# Altium footprint library Supernova Connectors.PcbLib: 303 footprints (part 10 of 19)
Each footprint in its own frame and in the unit in brackets; x right, y up, seen from the top. Pads: shape width x height; smd on the part's side, far side on the other; paste and mask are expansions set on the pad; w line width, h text height; cw(c..) or ccw(c..) is an arc to the next point about the centre after c.
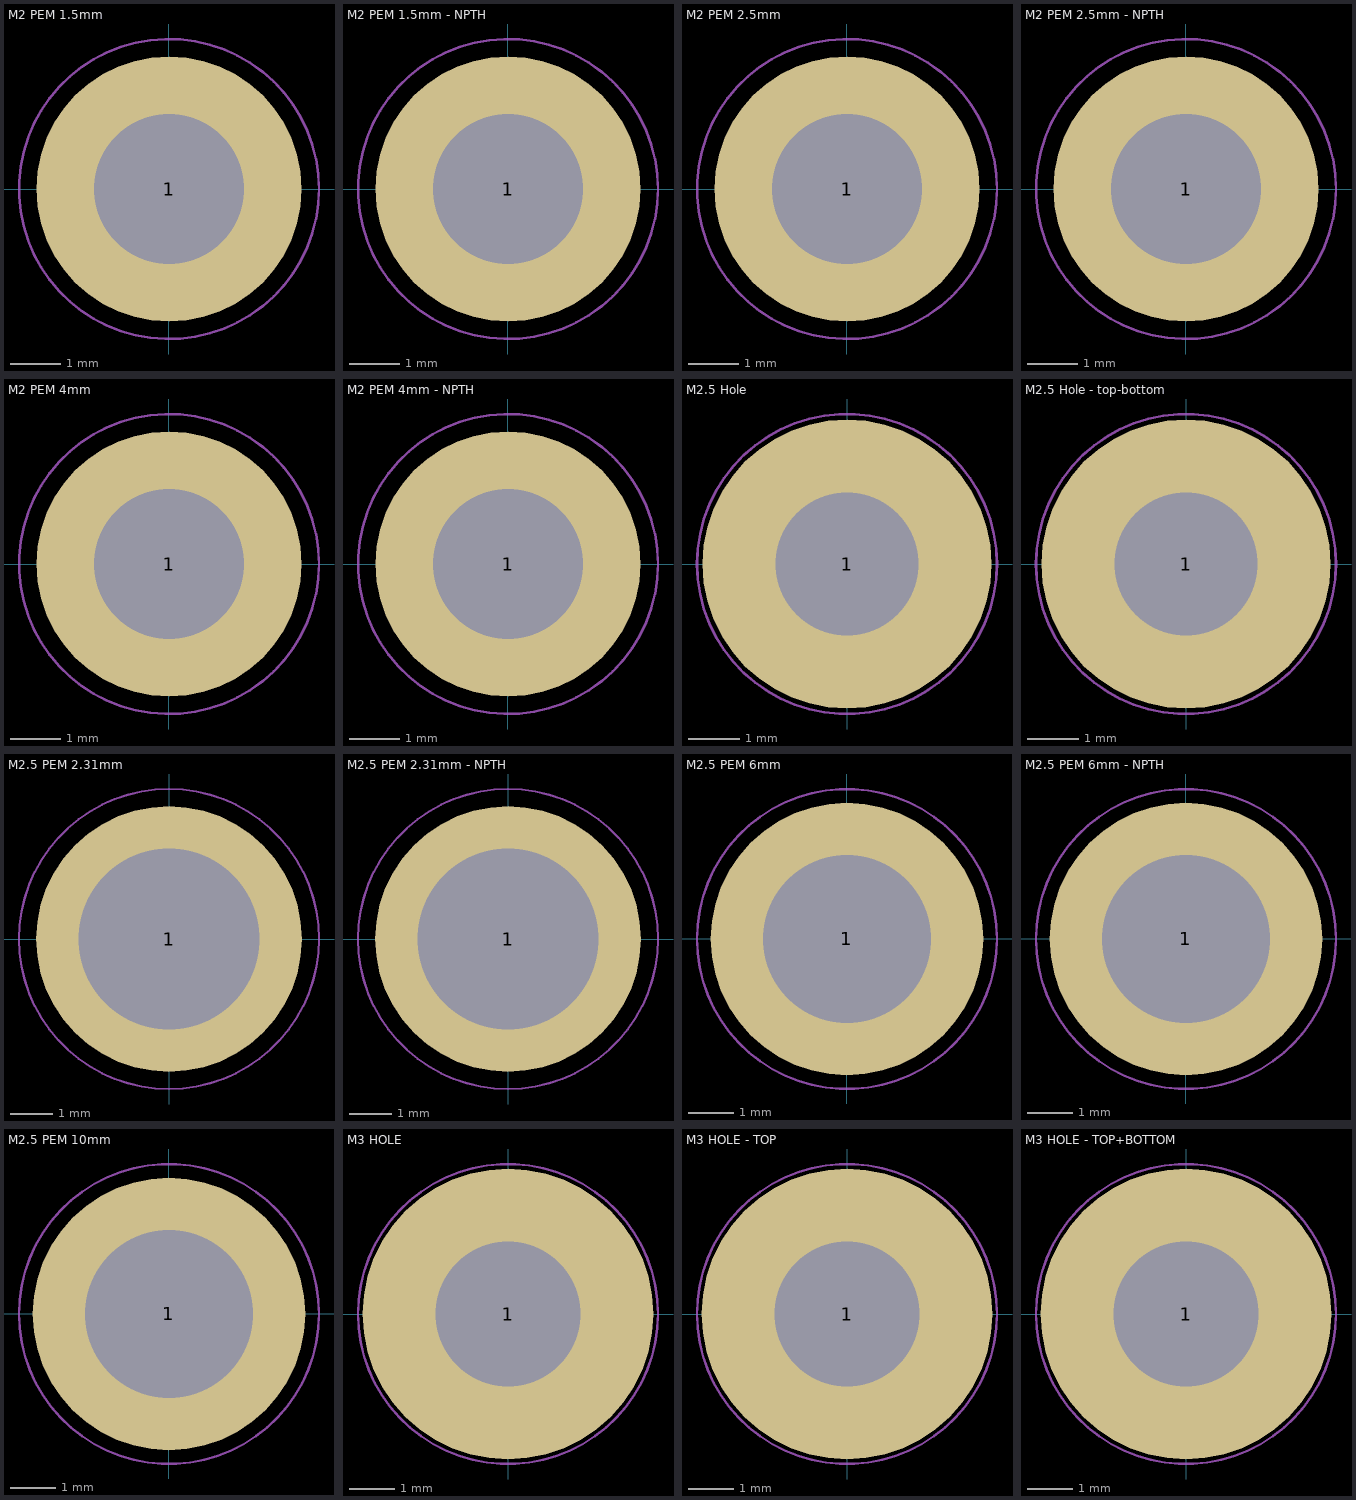
[diagram p9: the footprints below, top view; thin cyan lines are the x and y axes]

## M2 PEM 1.5mm [mm] "2.5mm M2 PEM"
height 2.5
pads (1):
  round 5.3 / inner round 0 / far side round 3.5 hole 3: 1(0,0)
Top Paste:
  region: 0.3,-2.542 0.3,-1.521 0.411,-1.494 0.627,-1.418 0.829,-1.31 1.012,-1.174 1.174,-1.012 1.31,-0.828 1.418,-0.627 1.495,-0.411 1.521,-0.3 2.543,-0.3 2.543,-0.298 2.518,-0.511 2.398,-0.922 2.211,-1.308 1.963,-1.658 1.659,-1.961 1.31,-2.21 0.924,-2.397 0.513,-2.517
  region: 2.542,0.3 1.521,0.3 1.495,0.411 1.418,0.627 1.31,0.829 1.174,1.012 1.012,1.174 0.829,1.31 0.627,1.418 0.411,1.495 0.3,1.521 0.3,2.543 0.298,2.543 0.511,2.518 0.923,2.398 1.308,2.211 1.658,1.963 1.961,1.659 2.21,1.31 2.397,0.924 2.517,0.513
  region: -0.3,2.542 -0.3,1.521 -0.411,1.495 -0.627,1.418 -0.828,1.31 -1.012,1.174 -1.174,1.012 -1.31,0.829 -1.418,0.627 -1.494,0.411 -1.521,0.3 -2.543,0.3 -2.543,0.298 -2.518,0.511 -2.398,0.923 -2.211,1.308 -1.962,1.658 -1.659,1.961 -1.31,2.21 -0.924,2.397 -0.513,2.517
  region: -2.542,-0.3 -1.521,-0.3 -1.494,-0.411 -1.418,-0.627 -1.31,-0.828 -1.174,-1.012 -1.012,-1.174 -0.828,-1.31 -0.627,-1.418 -0.411,-1.494 -0.3,-1.521 -0.3,-2.543 -0.298,-2.543 -0.511,-2.518 -0.922,-2.398 -1.308,-2.211 -1.658,-1.962 -1.961,-1.659 -2.21,-1.31 -2.397,-0.924 -2.517,-0.513
Top Courtyard:
  circle w0.05: c0,0 r3
  lines w0.1: -0.5,0 0.5,0 ; 0,-0.5 0,0.5
3D body "9774015243R (rev1).stp": height 1.5, standoff -1.4, extent -2.175,-2.172 2.175,2.172

## M2 PEM 1.5mm - NPTH [mm] "2.5mm M2 PEM"
height 2.5
pads (1):
  round 5.3 / inner round 0 / far side round 0 hole 3 unplated: 1(0,0)
Top Paste:
  region: -2.542,-0.3 -1.521,-0.3 -1.494,-0.411 -1.418,-0.627 -1.31,-0.828 -1.174,-1.012 -1.012,-1.174 -0.828,-1.31 -0.627,-1.418 -0.411,-1.494 -0.3,-1.521 -0.3,-2.543 -0.298,-2.543 -0.511,-2.518 -0.922,-2.398 -1.308,-2.211 -1.658,-1.962 -1.961,-1.659 -2.21,-1.31 -2.397,-0.924 -2.517,-0.513
  region: -0.3,2.542 -0.3,1.521 -0.411,1.495 -0.627,1.418 -0.828,1.31 -1.012,1.174 -1.174,1.012 -1.31,0.829 -1.418,0.627 -1.494,0.411 -1.521,0.3 -2.543,0.3 -2.543,0.298 -2.518,0.511 -2.398,0.923 -2.211,1.308 -1.962,1.658 -1.659,1.961 -1.31,2.21 -0.924,2.397 -0.513,2.517
  region: 2.542,0.3 1.521,0.3 1.495,0.411 1.418,0.627 1.31,0.829 1.174,1.012 1.012,1.174 0.829,1.31 0.627,1.418 0.411,1.495 0.3,1.521 0.3,2.543 0.298,2.543 0.511,2.518 0.923,2.398 1.308,2.211 1.658,1.963 1.961,1.659 2.21,1.31 2.397,0.924 2.517,0.513
  region: 0.3,-2.542 0.3,-1.521 0.411,-1.494 0.627,-1.418 0.829,-1.31 1.012,-1.174 1.174,-1.012 1.31,-0.828 1.418,-0.627 1.495,-0.411 1.521,-0.3 2.543,-0.3 2.543,-0.298 2.518,-0.511 2.398,-0.922 2.211,-1.308 1.963,-1.658 1.659,-1.961 1.31,-2.21 0.924,-2.397 0.513,-2.517
Top Courtyard:
  circle w0.05: c0,0 r3
  lines w0.1: -0.5,0 0.5,0 ; 0,-0.5 0,0.5
3D body "9774015243R (rev1).stp": height 1.5, standoff -1.4, extent -2.175,-2.172 2.175,2.172

## M2 PEM 2.5mm [mm] "2.5mm M2 PEM"
height 2.5
pads (1):
  round 5.3 / inner round 0 / far side round 3.5 hole 3: 1(0,0)
Top Paste:
  region: -2.542,-0.3 -1.521,-0.3 -1.494,-0.411 -1.418,-0.627 -1.31,-0.828 -1.174,-1.012 -1.012,-1.174 -0.828,-1.31 -0.627,-1.418 -0.411,-1.494 -0.3,-1.521 -0.3,-2.543 -0.298,-2.543 -0.511,-2.518 -0.922,-2.398 -1.308,-2.211 -1.658,-1.962 -1.961,-1.659 -2.21,-1.31 -2.397,-0.924 -2.517,-0.513
  region: -0.3,2.542 -0.3,1.521 -0.411,1.495 -0.627,1.418 -0.828,1.31 -1.012,1.174 -1.174,1.012 -1.31,0.829 -1.418,0.627 -1.494,0.411 -1.521,0.3 -2.543,0.3 -2.543,0.298 -2.518,0.511 -2.398,0.923 -2.211,1.308 -1.962,1.658 -1.659,1.961 -1.31,2.21 -0.924,2.397 -0.513,2.517
  region: 2.542,0.3 1.521,0.3 1.495,0.411 1.418,0.627 1.31,0.829 1.174,1.012 1.012,1.174 0.829,1.31 0.627,1.418 0.411,1.495 0.3,1.521 0.3,2.543 0.298,2.543 0.511,2.518 0.923,2.398 1.308,2.211 1.658,1.963 1.961,1.659 2.21,1.31 2.397,0.924 2.517,0.513
  region: 0.3,-2.542 0.3,-1.521 0.411,-1.494 0.627,-1.418 0.829,-1.31 1.012,-1.174 1.174,-1.012 1.31,-0.828 1.418,-0.627 1.495,-0.411 1.521,-0.3 2.543,-0.3 2.543,-0.298 2.518,-0.511 2.398,-0.922 2.211,-1.308 1.963,-1.658 1.659,-1.961 1.31,-2.21 0.924,-2.397 0.513,-2.517
Top Courtyard:
  circle w0.05: c0,0 r3
  lines w0.1: -0.5,0 0.5,0 ; 0,-0.5 0,0.5
3D body "9774025943 (rev1).stp": height 2.5, standoff -1.4, extent -2.175,-2.172 2.175,2.172

## M2 PEM 2.5mm - NPTH [mm] "2.5mm M2 PEM"
height 2.5
pads (1):
  round 5.3 / inner round 0 / far side round 0 hole 3 unplated: 1(0,0)
Top Paste:
  region: -2.542,-0.3 -1.521,-0.3 -1.494,-0.411 -1.418,-0.627 -1.31,-0.828 -1.174,-1.012 -1.012,-1.174 -0.828,-1.31 -0.627,-1.418 -0.411,-1.494 -0.3,-1.521 -0.3,-2.543 -0.298,-2.543 -0.511,-2.518 -0.922,-2.398 -1.308,-2.211 -1.658,-1.962 -1.961,-1.659 -2.21,-1.31 -2.397,-0.924 -2.517,-0.513
  region: -0.3,2.542 -0.3,1.521 -0.411,1.495 -0.627,1.418 -0.828,1.31 -1.012,1.174 -1.174,1.012 -1.31,0.829 -1.418,0.627 -1.494,0.411 -1.521,0.3 -2.543,0.3 -2.543,0.298 -2.518,0.511 -2.398,0.923 -2.211,1.308 -1.962,1.658 -1.659,1.961 -1.31,2.21 -0.924,2.397 -0.513,2.517
  region: 2.542,0.3 1.521,0.3 1.495,0.411 1.418,0.627 1.31,0.829 1.174,1.012 1.012,1.174 0.829,1.31 0.627,1.418 0.411,1.495 0.3,1.521 0.3,2.543 0.298,2.543 0.511,2.518 0.923,2.398 1.308,2.211 1.658,1.963 1.961,1.659 2.21,1.31 2.397,0.924 2.517,0.513
  region: 0.3,-2.542 0.3,-1.521 0.411,-1.494 0.627,-1.418 0.829,-1.31 1.012,-1.174 1.174,-1.012 1.31,-0.828 1.418,-0.627 1.495,-0.411 1.521,-0.3 2.543,-0.3 2.543,-0.298 2.518,-0.511 2.398,-0.922 2.211,-1.308 1.963,-1.658 1.659,-1.961 1.31,-2.21 0.924,-2.397 0.513,-2.517
Top Courtyard:
  circle w0.05: c0,0 r3
  lines w0.1: -0.5,0 0.5,0 ; 0,-0.5 0,0.5
3D body "9774025943 (rev1).stp": height 2.5, standoff -1.4, extent -2.175,-2.172 2.175,2.172

## M2 PEM 4mm [mm] "4mm M2 PEM"
height 4
pads (1):
  round 5.3 / inner round 0 / far side round 3.5 hole 3: 1(0,0)
Top Paste:
  region: -2.542,-0.3 -1.521,-0.3 -1.494,-0.411 -1.418,-0.627 -1.31,-0.828 -1.174,-1.012 -1.012,-1.174 -0.828,-1.31 -0.627,-1.418 -0.411,-1.494 -0.3,-1.521 -0.3,-2.543 -0.298,-2.543 -0.511,-2.518 -0.922,-2.398 -1.308,-2.211 -1.658,-1.962 -1.961,-1.659 -2.21,-1.31 -2.397,-0.924 -2.517,-0.513
  region: -0.3,2.542 -0.3,1.521 -0.411,1.495 -0.627,1.418 -0.828,1.31 -1.012,1.174 -1.174,1.012 -1.31,0.829 -1.418,0.627 -1.494,0.411 -1.521,0.3 -2.543,0.3 -2.543,0.298 -2.518,0.511 -2.398,0.923 -2.211,1.308 -1.962,1.658 -1.659,1.961 -1.31,2.21 -0.924,2.397 -0.513,2.517
  region: 2.542,0.3 1.521,0.3 1.495,0.411 1.418,0.627 1.31,0.829 1.174,1.012 1.012,1.174 0.829,1.31 0.627,1.418 0.411,1.495 0.3,1.521 0.3,2.543 0.298,2.543 0.511,2.518 0.923,2.398 1.308,2.211 1.658,1.963 1.961,1.659 2.21,1.31 2.397,0.924 2.517,0.513
  region: 0.3,-2.542 0.3,-1.521 0.411,-1.494 0.627,-1.418 0.829,-1.31 1.012,-1.174 1.174,-1.012 1.31,-0.828 1.418,-0.627 1.495,-0.411 1.521,-0.3 2.543,-0.3 2.543,-0.298 2.518,-0.511 2.398,-0.922 2.211,-1.308 1.963,-1.658 1.659,-1.961 1.31,-2.21 0.924,-2.397 0.513,-2.517
Top Courtyard:
  circle w0.05: c0,0 r3
  lines w0.1: -0.5,0 0.5,0 ; 0,-0.5 0,0.5
3D body "9774040243R (rev1).stp": height 4, standoff -1.4, extent -2.175,-2.172 2.175,2.172

## M2 PEM 4mm - NPTH [mm] "4mm M2 PEM"
height 4
pads (1):
  round 5.3 / inner round 0 / far side round 0 hole 3 unplated: 1(0,0)
Top Paste:
  region: -2.542,-0.3 -1.521,-0.3 -1.494,-0.411 -1.418,-0.627 -1.31,-0.828 -1.174,-1.012 -1.012,-1.174 -0.828,-1.31 -0.627,-1.418 -0.411,-1.494 -0.3,-1.521 -0.3,-2.543 -0.298,-2.543 -0.511,-2.518 -0.922,-2.398 -1.308,-2.211 -1.658,-1.962 -1.961,-1.659 -2.21,-1.31 -2.397,-0.924 -2.517,-0.513
  region: -0.3,2.542 -0.3,1.521 -0.411,1.495 -0.627,1.418 -0.828,1.31 -1.012,1.174 -1.174,1.012 -1.31,0.829 -1.418,0.627 -1.494,0.411 -1.521,0.3 -2.543,0.3 -2.543,0.298 -2.518,0.511 -2.398,0.923 -2.211,1.308 -1.962,1.658 -1.659,1.961 -1.31,2.21 -0.924,2.397 -0.513,2.517
  region: 2.542,0.3 1.521,0.3 1.495,0.411 1.418,0.627 1.31,0.829 1.174,1.012 1.012,1.174 0.829,1.31 0.627,1.418 0.411,1.495 0.3,1.521 0.3,2.543 0.298,2.543 0.511,2.518 0.923,2.398 1.308,2.211 1.658,1.963 1.961,1.659 2.21,1.31 2.397,0.924 2.517,0.513
  region: 0.3,-2.542 0.3,-1.521 0.411,-1.494 0.627,-1.418 0.829,-1.31 1.012,-1.174 1.174,-1.012 1.31,-0.828 1.418,-0.627 1.495,-0.411 1.521,-0.3 2.543,-0.3 2.543,-0.298 2.518,-0.511 2.398,-0.922 2.211,-1.308 1.963,-1.658 1.659,-1.961 1.31,-2.21 0.924,-2.397 0.513,-2.517
Top Courtyard:
  circle w0.05: c0,0 r3
  lines w0.1: -0.5,0 0.5,0 ; 0,-0.5 0,0.5
3D body "9774040243R (rev1).stp": height 4, standoff -1.4, extent -2.175,-2.172 2.175,2.172

## M2.5 Hole [mil]
pads (1):
  round 220 hole 109: 1(0,0)
Top Courtyard:
  circle w1.97: c0,0 r114.17

## M2.5 Hole - top-bottom [mil]
pads (1):
  round 220 / inner round 150 / far side round 220 hole 109: 1(0,0)
Top Courtyard:
  circle w1.97: c0,0 r114.17

## M2.5 PEM 2.31mm [mm] "2.31mm M2.5 PEM"
height 2.31
pads (1):
  round 6.2 / inner round 0 / far side round 5 hole 4.22: 1(0,0)
Top Paste:
  region: -2.985,-0.3 -2.179,-0.3 -2.148,-0.476 -2.043,-0.816 -1.884,-1.135 -1.676,-1.425 -1.424,-1.677 -1.135,-1.884 -0.816,-2.043 -0.475,-2.148 -0.3,-2.179 -0.3,-2.985 -0.556,-2.959 -1.053,-2.821 -1.518,-2.6 -1.939,-2.303 -2.303,-1.939 -2.6,-1.518 -2.821,-1.053 -2.959,-0.556
  region: -0.3,2.985 -0.3,2.179 -0.475,2.148 -0.816,2.043 -1.135,1.884 -1.424,1.676 -1.676,1.425 -1.884,1.135 -2.043,0.816 -2.148,0.476 -2.179,0.3 -2.985,0.3 -2.959,0.556 -2.821,1.053 -2.6,1.518 -2.303,1.939 -1.939,2.303 -1.518,2.6 -1.053,2.821 -0.556,2.959
  region: 2.985,0.3 2.179,0.3 2.148,0.476 2.043,0.816 1.884,1.135 1.676,1.425 1.425,1.677 1.135,1.884 0.816,2.043 0.476,2.148 0.3,2.179 0.3,2.985 0.556,2.959 1.053,2.821 1.518,2.6 1.939,2.303 2.303,1.939 2.6,1.518 2.821,1.053 2.959,0.556
  region: 0.3,-2.985 0.3,-2.179 0.476,-2.148 0.816,-2.043 1.135,-1.884 1.425,-1.676 1.677,-1.425 1.884,-1.135 2.043,-0.816 2.148,-0.476 2.179,-0.3 2.985,-0.3 2.959,-0.556 2.821,-1.053 2.6,-1.518 2.303,-1.939 1.939,-2.303 1.518,-2.6 1.053,-2.821 0.556,-2.959
Top Courtyard:
  circle w0.05: c0,0 r3.5
  lines w0.1: -0.5,0 0.5,0 ; 0,-0.5 0,0.5
3D body "2.31mm PEM.step": height 2.31, standoff -1.53, extent -2.78,-2.78 2.78,2.78

## M2.5 PEM 2.31mm - NPTH [mm] "2.31mm M2.5 PEM"
height 2.31
pads (1):
  round 6.2 / inner round 0 / far side round 0 hole 4.22 unplated: 1(0,0)
Top Paste:
  region: 0.3,-2.985 0.3,-2.179 0.476,-2.148 0.816,-2.043 1.135,-1.884 1.425,-1.676 1.677,-1.425 1.884,-1.135 2.043,-0.816 2.148,-0.476 2.179,-0.3 2.985,-0.3 2.959,-0.556 2.821,-1.053 2.6,-1.518 2.303,-1.939 1.939,-2.303 1.518,-2.6 1.053,-2.821 0.556,-2.959
  region: 2.985,0.3 2.179,0.3 2.148,0.476 2.043,0.816 1.884,1.135 1.676,1.425 1.425,1.677 1.135,1.884 0.816,2.043 0.476,2.148 0.3,2.179 0.3,2.985 0.556,2.959 1.053,2.821 1.518,2.6 1.939,2.303 2.303,1.939 2.6,1.518 2.821,1.053 2.959,0.556
  region: -0.3,2.985 -0.3,2.179 -0.475,2.148 -0.816,2.043 -1.135,1.884 -1.424,1.676 -1.676,1.425 -1.884,1.135 -2.043,0.816 -2.148,0.476 -2.179,0.3 -2.985,0.3 -2.959,0.556 -2.821,1.053 -2.6,1.518 -2.303,1.939 -1.939,2.303 -1.518,2.6 -1.053,2.821 -0.556,2.959
  region: -2.985,-0.3 -2.179,-0.3 -2.148,-0.476 -2.043,-0.816 -1.884,-1.135 -1.676,-1.425 -1.424,-1.677 -1.135,-1.884 -0.816,-2.043 -0.475,-2.148 -0.3,-2.179 -0.3,-2.985 -0.556,-2.959 -1.053,-2.821 -1.518,-2.6 -1.939,-2.303 -2.303,-1.939 -2.6,-1.518 -2.821,-1.053 -2.959,-0.556
Top Courtyard:
  circle w0.05: c0,0 r3.5
  lines w0.1: -0.5,0 0.5,0 ; 0,-0.5 0,0.5
3D body "2.31mm PEM.step": height 2.31, standoff -1.53, extent -2.78,-2.78 2.78,2.78

## M2.5 PEM 6mm [mm] "6mm M2.5 PEM"
height 6
pads (1):
  round 6 / inner round 0 / far side round 4.3 hole 3.7: 1(0,0)
Top Paste:
  region: 0.3,-2.884 0.3,-1.98 0.297,-1.98 0.454,-1.95 0.757,-1.854 1.041,-1.711 1.299,-1.524 1.524,-1.299 1.711,-1.041 1.854,-0.757 1.95,-0.454 1.98,-0.297 1.98,-0.3 2.884,-0.3 2.859,-0.546 2.725,-1.023 2.512,-1.471 2.226,-1.875 1.875,-2.226 1.471,-2.512 1.023,-2.725 0.546,-2.859
  region: 2.884,0.3 1.98,0.3 1.98,0.297 1.951,0.453 1.854,0.757 1.711,1.041 1.524,1.299 1.299,1.524 1.041,1.711 0.757,1.854 0.454,1.95 0.297,1.98 0.3,1.98 0.3,2.884 0.546,2.859 1.023,2.725 1.471,2.512 1.875,2.226 2.226,1.875 2.512,1.471 2.725,1.023 2.859,0.546
  region: -0.3,2.884 -0.3,1.98 -0.297,1.98 -0.453,1.95 -0.757,1.854 -1.041,1.711 -1.299,1.524 -1.524,1.299 -1.71,1.041 -1.854,0.757 -1.95,0.454 -1.98,0.297 -1.98,0.3 -2.884,0.3 -2.859,0.546 -2.725,1.023 -2.511,1.471 -2.226,1.875 -1.875,2.226 -1.471,2.512 -1.023,2.725 -0.546,2.859
  region: -2.884,-0.3 -1.98,-0.3 -1.98,-0.297 -1.95,-0.453 -1.854,-0.757 -1.711,-1.041 -1.524,-1.299 -1.299,-1.524 -1.041,-1.711 -0.757,-1.854 -0.453,-1.95 -0.297,-1.98 -0.3,-1.98 -0.3,-2.884 -0.546,-2.859 -1.023,-2.725 -1.471,-2.512 -1.875,-2.226 -2.226,-1.875 -2.512,-1.471 -2.725,-1.023 -2.859,-0.546
Top Courtyard:
  circle w0.05: c0,0 r3.302
  lines w0.1: -0.5,0 0.5,0 ; 0,-0.5 0,0.5
3D body "9774060151R (rev1).stp": height 6, standoff -1.4, extent -2.55,-2.547 2.55,2.547

## M2.5 PEM 6mm - NPTH [mm] "6mm M2.5 PEM"
height 6
pads (1):
  round 6 / inner round 0 / far side round 0 hole 3.7 unplated: 1(0,0)
Top Paste:
  region: 0.3,-2.884 0.3,-1.98 0.297,-1.98 0.454,-1.95 0.757,-1.854 1.041,-1.711 1.299,-1.524 1.524,-1.299 1.711,-1.041 1.854,-0.757 1.95,-0.454 1.98,-0.297 1.98,-0.3 2.884,-0.3 2.859,-0.546 2.725,-1.023 2.512,-1.471 2.226,-1.875 1.875,-2.226 1.471,-2.512 1.023,-2.725 0.546,-2.859
  region: 2.884,0.3 1.98,0.3 1.98,0.297 1.951,0.453 1.854,0.757 1.711,1.041 1.524,1.299 1.299,1.524 1.041,1.711 0.757,1.854 0.454,1.95 0.297,1.98 0.3,1.98 0.3,2.884 0.546,2.859 1.023,2.725 1.471,2.512 1.875,2.226 2.226,1.875 2.512,1.471 2.725,1.023 2.859,0.546
  region: -0.3,2.884 -0.3,1.98 -0.297,1.98 -0.453,1.95 -0.757,1.854 -1.041,1.711 -1.299,1.524 -1.524,1.299 -1.71,1.041 -1.854,0.757 -1.95,0.454 -1.98,0.297 -1.98,0.3 -2.884,0.3 -2.859,0.546 -2.725,1.023 -2.511,1.471 -2.226,1.875 -1.875,2.226 -1.471,2.512 -1.023,2.725 -0.546,2.859
  region: -2.884,-0.3 -1.98,-0.3 -1.98,-0.297 -1.95,-0.453 -1.854,-0.757 -1.711,-1.041 -1.524,-1.299 -1.299,-1.524 -1.041,-1.711 -0.757,-1.854 -0.453,-1.95 -0.297,-1.98 -0.3,-1.98 -0.3,-2.884 -0.546,-2.859 -1.023,-2.725 -1.471,-2.512 -1.875,-2.226 -2.226,-1.875 -2.512,-1.471 -2.725,-1.023 -2.859,-0.546
Top Courtyard:
  circle w0.05: c0,0 r3.302
  lines w0.1: -0.5,0 0.5,0 ; 0,-0.5 0,0.5
3D body "9774060151R (rev1).stp": height 6, standoff -1.4, extent -2.55,-2.547 2.55,2.547

## M2.5 PEM 10mm [mm] "10mm M2.5 PEM"
height 6
pads (1):
  round 6 / inner round 0 / far side round 4.3 hole 3.7: 1(0,0)
Top Paste:
  region: 0.3,-2.884 0.3,-1.98 0.297,-1.98 0.454,-1.95 0.757,-1.854 1.041,-1.711 1.299,-1.524 1.524,-1.299 1.711,-1.041 1.854,-0.757 1.95,-0.454 1.98,-0.297 1.98,-0.3 2.884,-0.3 2.859,-0.546 2.725,-1.023 2.512,-1.471 2.226,-1.875 1.875,-2.226 1.471,-2.512 1.023,-2.725 0.546,-2.859
  region: 2.884,0.3 1.98,0.3 1.98,0.297 1.951,0.453 1.854,0.757 1.711,1.041 1.524,1.299 1.299,1.524 1.041,1.711 0.757,1.854 0.454,1.95 0.297,1.98 0.3,1.98 0.3,2.884 0.546,2.859 1.023,2.725 1.471,2.512 1.875,2.226 2.226,1.875 2.512,1.471 2.725,1.023 2.859,0.546
  region: -0.3,2.884 -0.3,1.98 -0.297,1.98 -0.453,1.95 -0.757,1.854 -1.041,1.711 -1.299,1.524 -1.524,1.299 -1.71,1.041 -1.854,0.757 -1.95,0.454 -1.98,0.297 -1.98,0.3 -2.884,0.3 -2.859,0.546 -2.725,1.023 -2.511,1.471 -2.226,1.875 -1.875,2.226 -1.471,2.512 -1.023,2.725 -0.546,2.859
  region: -2.884,-0.3 -1.98,-0.3 -1.98,-0.297 -1.95,-0.453 -1.854,-0.757 -1.711,-1.041 -1.524,-1.299 -1.299,-1.524 -1.041,-1.711 -0.757,-1.854 -0.453,-1.95 -0.297,-1.98 -0.3,-1.98 -0.3,-2.884 -0.546,-2.859 -1.023,-2.725 -1.471,-2.512 -1.875,-2.226 -2.226,-1.875 -2.512,-1.471 -2.725,-1.023 -2.859,-0.546
Top Courtyard:
  circle w0.05: c0,0 r3.302
  lines w0.1: -0.5,0 0.5,0 ; 0,-0.5 0,0.5
3D body "9774100151R (rev1).stp": height 10, standoff -1.4, extent -2.55,-2.547 2.55,2.547

## M3 HOLE [mm]
pads (1):
  round 6.35 hole 3.175: 1(0,0)
Top Courtyard:
  circle w0.05: c0,0 r3.275

## M3 HOLE - TOP [mm]
pads (1):
  round 6.35 / inner round 4 / far side round 4 hole 3.175: 1(0,0)
Top Courtyard:
  circle w0.05: c0,0 r3.275

## M3 HOLE - TOP+BOTTOM [mm]
pads (1):
  round 6.35 / inner round 5.6 / far side round 6.35 hole 3.175: 1(0,0)
Top Courtyard:
  circle w0.05: c0,0 r3.275